# Altium integrated library LEMO Unipole And Multipole Type Connectors.IntLib: 1566 symbols (part 2 of 13) (continued)
## ECG.3B.320.CLV
designator J?
Fixed receptacle with two nuts, with elbow contact for printed circuit (back panel mounting), Key (G), 3B series, Multipole Type with 20 Contacts; Manufacturer: LEMO; PartNumber: ECG.3B.320.CLV; Number of contacts: 20; Contact Diameter: 0.7 mm; AWG: 24; Rated Current(A): 0; DatasheetVersion: Jun-14; PackageReference: ECG.3B.320.CLV; PackageDescription: Fixed receptacle with two nuts, with elbow contact for printed circuit (back panel mounting), Key(G) for Printed Circuit; Supplier 1: Mouser; Supplier Part Number 1: 736-ECG3B320CLV; Supplier 2: Digi-Key; Supplier Part Number 2: ECG.3B.320.CLV-ND; ComponentLink1Description: Manufacturer URL; ComponentLink1URL: http://www.lemo.com; ComponentLink2Description: Datasheet; ComponentLink2URL: http://intra.lemo.ch/catalog/ROW/UK_English/unipole_multipole.pdf
footprint ECG.3B.320.CLV (Socket, Female, Body 18mm dia. Height 25.8 mm, Through hole)
pins: 1, 2, 3, 4, 5, 6, 7, 8, 9, 10, 11, 12, 13, 14, 15, 16, 17, 18, 19, 20

## ECG.3B.324.CLN
designator J?
Fixed receptacle with two nuts and straight contact for printed circuit (back panel mounting), Key (G), 3B series, Multipole Type with 24 Contacts; Manufacturer: LEMO; PartNumber: ECG.3B.324.CLN; Number of contacts: 24; Contact Diameter: 0.7 mm; Rated Current(A): 4; DatasheetVersion: Jun-14; PackageReference: ECG.3B.324.CLN; PackageDescription: Fixed receptacle with two nuts and straight contact for printed circuit (back panel mounting), Key(G) for Printed Circuit; AWG: 24; ComponentLink1Description: Manufacturer URL; ComponentLink1URL: http://www.lemo.com; ComponentLink2Description: Datasheet; ComponentLink2URL: http://intra.lemo.ch/catalog/ROW/UK_English/unipole_multipole.pdf
footprint ECG.3B.324.CLN (Socket, Female, Body 18mm dia. Height 25.8 mm, Through hole)
pins: 1, 2, 3, 4, 5, 6, 7, 8, 9, 10, 11, 12, 13, 14, 15, 16, 17, 18, 19, 20, 21, 22, 23, 24

## ECG.3B.324.CLV
designator J?
Fixed receptacle with two nuts, with elbow contact for printed circuit (back panel mounting), Key (G), 3B series, Multipole Type with 24 Contacts; Manufacturer: LEMO; PartNumber: ECG.3B.324.CLV; Number of contacts: 24; Contact Diameter: 0.7 mm; Rated Current(A): 0; DatasheetVersion: Jun-14; PackageReference: ECG.3B.324.CLV; PackageDescription: Fixed receptacle with two nuts, with elbow contact for printed circuit (back panel mounting), Key(G) for Printed Circuit; Supplier 1: Mouser; Supplier Part Number 1: 736-ECG3B324CLV; Supplier 2: Digi-Key; Supplier Part Number 2: ECG.3B.324.CLV-ND; AWG: 24; ComponentLink1Description: Manufacturer URL; ComponentLink1URL: http://www.lemo.com; ComponentLink2Description: Datasheet; ComponentLink2URL: http://intra.lemo.ch/catalog/ROW/UK_English/unipole_multipole.pdf
footprint ECG.3B.324.CLV (Socket, Female, Body 18mm dia. Height 25.8 mm, Through hole)
pins: 1, 2, 3, 4, 5, 6, 7, 8, 9, 10, 11, 12, 13, 14, 15, 16, 17, 18, 19, 20, 21, 22, 23, 24

## ECG.3B.330.CLV
designator J?
Fixed receptacle with two nuts, with elbow contact for printed circuit (back panel mounting), Key (G), 3B series, Multipole Type with 30 Contacts; Manufacturer: LEMO; PartNumber: ECG.3B.330.CLV; Number of contacts: 30; Contact Diameter: 0.7 mm; AWG: 24; Rated Current(A): 0; DatasheetVersion: Jun-14; PackageReference: ECG.3B.330.CLV; PackageDescription: Fixed receptacle with two nuts, with elbow contact for printed circuit (back panel mounting), Key(G) for Printed Circuit; Supplier 1: Mouser; Supplier Part Number 1: 736-ECG3B330CLV; Supplier 2: Digi-Key; Supplier Part Number 2: ECG.3B.330.CLV-ND; ComponentLink1Description: Manufacturer URL; ComponentLink1URL: http://www.lemo.com; ComponentLink2Description: Datasheet; ComponentLink2URL: http://intra.lemo.ch/catalog/ROW/UK_English/unipole_multipole.pdf
footprint ECG.3B.330.CLV (Socket, Female, Body 18mm dia. Height 25.8 mm, Through hole)
pins: 1, 2, 3, 4, 5, 6, 7, 8, 9, 10, 11, 12, 13, 14, 15, 16, 17, 18, 19, 20, 21, 22, 23, 24, 25, 26, 27, 28, 29, 30

## ECG.4B.316.CLN
designator J?
Fixed receptacle with two nuts and straight contact for printed circuit (back panel mounting), Key (G), 4B series, Multipole Type with 16 Contacts; Manufacturer: LEMO; PartNumber: ECG.4B.316.CLN; Number of contacts: 16; Contact Diameter: 0.9 mm; AWG: 22; Rated Current(A): 10; DatasheetVersion: Jun-14; PackageReference: ECG.4B.316.CLN; PackageDescription: Fixed receptacle with two nuts and straight contact for printed circuit (back panel mounting), Key(G) for Printed Circuit; Supplier 1: Mouser; Supplier Part Number 1: 736-ECG4B316CLN; Supplier 2: Digi-Key; Supplier Part Number 2: ECG.4B.316.CLN-ND; ComponentLink1Description: Manufacturer URL; ComponentLink1URL: http://www.lemo.com; ComponentLink2Description: Datasheet; ComponentLink2URL: http://intra.lemo.ch/catalog/ROW/UK_English/unipole_multipole.pdf
footprint ECG.4B.316.CLN (Socket, Female, Body 25mm dia. Height 29.8 mm, Through hole)
pins: 1, 2, 3, 4, 5, 6, 7, 8, 9, 10, 11, 12, 13, 14, 15, 16

## ECG.4B.324.CLN
designator J?
Fixed receptacle with two nuts and straight contact for printed circuit (back panel mounting), Key (G), 4B series, Multipole Type with 24 Contacts; Manufacturer: LEMO; PartNumber: ECG.4B.324.CLN; Number of contacts: 24; Contact Diameter: 0.9 mm; AWG: 22; Rated Current(A): 7; DatasheetVersion: Jun-14; PackageReference: ECG.4B.324.CLN; PackageDescription: Fixed receptacle with two nuts and straight contact for printed circuit (back panel mounting), Key(G) for Printed Circuit; Supplier 1: Mouser; Supplier Part Number 1: 736-ECG4B324CLN; Supplier 2: Digi-Key; Supplier Part Number 2: ECG.4B.324.CLN-ND; ComponentLink1Description: Manufacturer URL; ComponentLink1URL: http://www.lemo.com; ComponentLink2Description: Datasheet; ComponentLink2URL: http://intra.lemo.ch/catalog/ROW/UK_English/unipole_multipole.pdf
footprint ECG.4B.324.CLN (Socket, Female, Body 25mm dia. Height 29.8 mm, Through hole)
pins: 1, 2, 3, 4, 5, 6, 7, 8, 9, 10, 11, 12, 13, 14, 15, 16, 17, 18, 19, 20, 21, 22, 23, 24

## ECN.0M.305.XLN
designator J?
Fixed receptacle with two nuts, Key (N), 0M series, Multipole Type with 5 Contacts; Manufacturer: LEMO; PartNumber: ECN.0M.305.XLN; Number of contacts: 5; Contact Diameter: 0.7 mm; AWG: 24; Rated Current(A): 6.5; DatasheetVersion: Jun-14; PackageReference: ECN.0M.305.XLN; PackageDescription: Fixed receptacle with two nuts, Key(N) for Printed Circuit; ComponentLink1Description: Manufacturer URL; ComponentLink1URL: http://www.lemo.com; ComponentLink2Description: Datasheet; ComponentLink2URL: http://intra.lemo.ch/catalog/ROW/UK_English/M_series.pdf
footprint ECN.0M.305.XLN (Socket, Female, Through hole)
pins: 1, 2, 3, 4, 5

## ECN.1M.308.XLN
designator J?
Fixed receptacle with two nuts, Key (N), 1M series, Multipole Type with 8 Contacts; Manufacturer: LEMO; PartNumber: ECN.1M.308.XLN; Number of contacts: 8; Contact Diameter: 0.7 mm; AWG: 24; Rated Current(A): 5; DatasheetVersion: Jun-14; PackageReference: ECN.1M.308.XLN; PackageDescription: Fixed receptacle with two nuts, Key(N) for Printed Circuit; ComponentLink1Description: Manufacturer URL; ComponentLink1URL: http://www.lemo.com; ComponentLink2Description: Datasheet; ComponentLink2URL: http://intra.lemo.ch/catalog/ROW/UK_English/M_series.pdf
footprint ECN.1M.308.XLN (Socket, Female, Through hole)
pins: 1, 2, 3, 4, 5, 6, 7, 8

## ECN.2M.319.XLN
designator J?
Fixed receptacle with two nuts, Key (N), 2M series, Multipole Type with 19 Contacts; Manufacturer: LEMO; PartNumber: ECN.2M.319.XLN; Number of contacts: 19; Contact Diameter: 0.7 mm; AWG: 24; Rated Current(A): 5; DatasheetVersion: Jun-14; PackageReference: ECN.2M.319.XLN; PackageDescription: Fixed receptacle with two nuts, Key(N) for Printed Circuit; ComponentLink1Description: Manufacturer URL; ComponentLink1URL: http://www.lemo.com; ComponentLink2Description: Datasheet; ComponentLink2URL: http://intra.lemo.ch/catalog/ROW/UK_English/M_series.pdf
footprint ECN.2M.319.XLN (Socket, Female, Through hole)
pins: 1, 2, 3, 4, 5, 6, 7, 8, 9, 10, 11, 12, 13, 14, 15, 16, 17, 18, 19

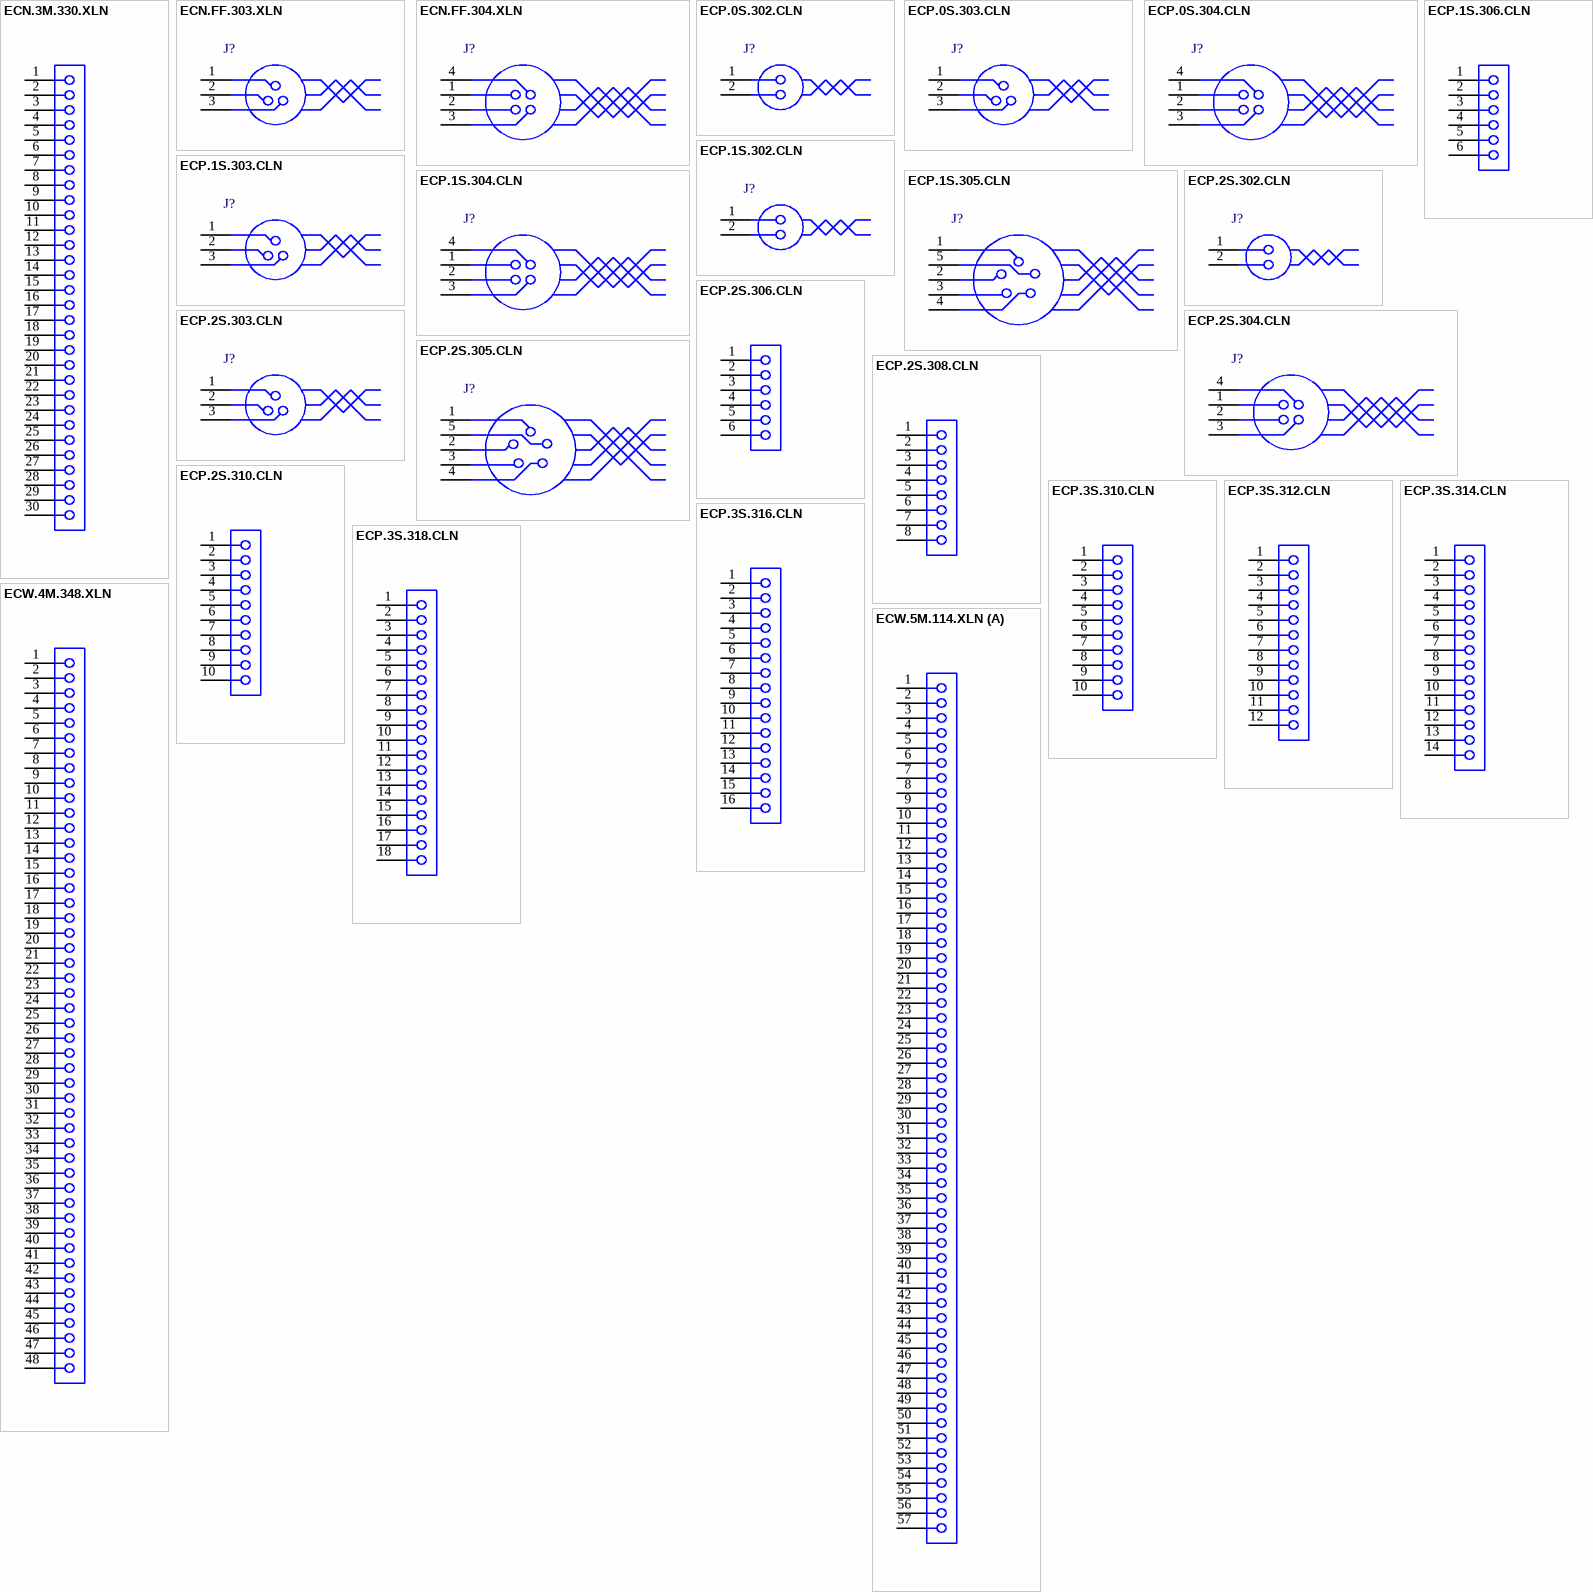
[diagram p4: symbols ECN.3M.330.XLN to ECW.5M.114.XLN]

## ECN.3M.330.XLN
designator J?
Fixed receptacle with two nuts, Key (N), 3M series, Multipole Type with 30 Contacts; Manufacturer: LEMO; PartNumber: ECN.3M.330.XLN; Number of contacts: 30; Contact Diameter: 0.7 mm; AWG: 24; Rated Current(A): 3.5; DatasheetVersion: Jun-14; PackageReference: ECN.3M.330.XLN; PackageDescription: Fixed receptacle with two nuts, Key(N) for Printed Circuit; ComponentLink1Description: Manufacturer URL; ComponentLink1URL: http://www.lemo.com; ComponentLink2Description: Datasheet; ComponentLink2URL: http://intra.lemo.ch/catalog/ROW/UK_English/M_series.pdf
footprint ECN.3M.330.XLN (Socket, Female, Through hole)
pins: 1, 2, 3, 4, 5, 6, 7, 8, 9, 10, 11, 12, 13, 14, 15, 16, 17, 18, 19, 20, 21, 22, 23, 24, 25, 26, 27, 28, 29, 30

## ECN.FF.303.XLN
designator J?
Fixed receptacle with 2 nuts key (N) or key (S), protruding shell (back panel mounting), Key (N), FF series, Multipole Type with; Manufacturer: LEMO; PartNumber: ECN.FF.303.XLN; Number of contacts: 0; Contact Diameter: 0.5 mm; AWG: 28; Test voltage Contact-Contact(Kv rms): 1.35; Test voltage Contact-Shell(Kv rms): 1.1; Rate Current(A): 3; DatasheetVersion: Jun-14; PackageReference: ECN.FF.303.XLN; PackageDescription: Fixed receptacle with 2 nuts key (N) or key (S), protruding shell (back panel mounting), Key(N) for Printed Circuit; ComponentLink1Description: Manufacturer URL; ComponentLink1URL: http://www.lemo.com; ComponentLink2Description: Datasheet; ComponentLink2URL: http://intra.lemo.ch/catalog/ROW/UK_English/f_series.pdf
footprint ECN.FF.303.XLN (Socket, Female, Through hole)
pins: 1, 2, 3

## ECN.FF.304.XLN
designator J?
Fixed receptacle with 2 nuts key (N) or key (S), protruding shell (back panel mounting), Key (N), FF series, Multipole Type with; Manufacturer: LEMO; PartNumber: ECN.FF.304.XLN; Number of contacts: 0; Contact Diameter: 0.5 mm; AWG: 28; Test voltage Contact-Contact(Kv rms): 1.05; Rate Current(A): 2; DatasheetVersion: Jun-14; PackageReference: ECN.FF.304.XLN; PackageDescription: Fixed receptacle with 2 nuts key (N) or key (S), protruding shell (back panel mounting), Key(N) for Printed Circuit; Supplier 1: Mouser; Supplier Part Number 1: 736-ECNFF304XLN; Supplier 2: Digi-Key; Supplier Part Number 2: ECN.FF.304.XLN-ND; Test voltage Contact-Shell(Kv rms): 1.05; ComponentLink1Description: Manufacturer URL; ComponentLink1URL: http://www.lemo.com; ComponentLink2Description: Datasheet; ComponentLink2URL: http://intra.lemo.ch/catalog/ROW/UK_English/f_series.pdf
footprint ECN.FF.304.XLN (Socket, Female, Through hole)
pins: 1, 2, 3, 4

## ECP.0S.302.CLN
designator J?
Fixed receptacle with two nuts, long threaded shell, with straight contact for printed circuit (back panel mounting), 0S series, Multipole Type with 2 Contacts; Manufacturer: LEMO; PartNumber: ECP.0S.302.CLN; Number of contacts: 2; Contact Diameter: 0.9 mm; AWG: 22; Rated Current(A): 10; DatasheetVersion: Jun-14; PackageReference: ECP.0S.302.CLN; PackageDescription: Fixed receptacle with two nuts, long threaded shell, with straight contact for printed circuit (back panel mounting), Key(P) for Printed Circuit; Supplier 1: Mouser; Supplier Part Number 1: 736-ECP.0S.302.CLN; Supplier 2: Digi-Key; Supplier Part Number 2: ECP.0S.302.CLN-ND; ComponentLink1Description: Manufacturer URL; ComponentLink1URL: http://www.lemo.com; ComponentLink2Description: Datasheet; ComponentLink2URL: http://intra.lemo.ch/catalog/ROW/UK_English/unipole_multipole.pdf
footprint ECP.0S.302.CLN (Socket, Female, Body 9mm dia. Height 15 mm, Through hole)
pins: 1, 2

## ECP.0S.303.CLN
designator J?
Fixed receptacle with two nuts, long threaded shell, with straight contact for printed circuit (back panel mounting), 0S series, Multipole Type with 3 Contacts; Manufacturer: LEMO; PartNumber: ECP.0S.303.CLN; Number of contacts: 3; Contact Diameter: 0.7 mm; AWG: 24; Rated Current(A): 7; DatasheetVersion: Jun-14; PackageReference: ECP.0S.303.CLN; PackageDescription: Fixed receptacle with two nuts, long threaded shell, with straight contact for printed circuit (back panel mounting), Key(P) for Printed Circuit; Supplier 1: Mouser; Supplier Part Number 1: 736-ECP0S303CLN; Supplier 2: Digi-Key; Supplier Part Number 2: ECP.0S.303.CLN-ND; ComponentLink1Description: Manufacturer URL; ComponentLink1URL: http://www.lemo.com; ComponentLink2Description: Datasheet; ComponentLink2URL: http://intra.lemo.ch/catalog/ROW/UK_English/unipole_multipole.pdf
footprint ECP.0S.303.CLN (Socket, Female, Body 9mm dia. Height 15 mm, Through hole)
pins: 1, 2, 3

## ECP.0S.304.CLN
designator J?
Fixed receptacle with two nuts, long threaded shell, with straight contact for printed circuit (back panel mounting), 0S series, Multipole Type with 4 Contacts; Manufacturer: LEMO; PartNumber: ECP.0S.304.CLN; Number of contacts: 4; Contact Diameter: 0.7 mm; AWG: 24; Rated Current(A): 7; DatasheetVersion: Jun-14; PackageReference: ECP.0S.304.CLN; PackageDescription: Fixed receptacle with two nuts, long threaded shell, with straight contact for printed circuit (back panel mounting), Key(P) for Printed Circuit; Supplier 1: Mouser; Supplier Part Number 1: 736-ECP0S304CLN; Supplier 2: Digi-Key; Supplier Part Number 2: ECP.0S.304.CLN-ND; ComponentLink1Description: Manufacturer URL; ComponentLink1URL: http://www.lemo.com; ComponentLink2Description: Datasheet; ComponentLink2URL: http://intra.lemo.ch/catalog/ROW/UK_English/unipole_multipole.pdf
footprint ECP.0S.304.CLN (Socket, Female, Body 9mm dia. Height 15 mm, Through hole)
pins: 1, 2, 3, 4

## ECP.1S.302.CLN
designator J?
Fixed receptacle with two nuts, long threaded shell, with straight contact for printed circuit (back panel mounting), 1S series, Multipole Type with 2 Contacts; Manufacturer: LEMO; PartNumber: ECP.1S.302.CLN; Number of contacts: 2; Contact Diameter: 1.3 mm; AWG: 20; Rated Current(A): 15; DatasheetVersion: Jun-14; PackageReference: ECP.1S.302.CLN; PackageDescription: Fixed receptacle with two nuts, long threaded shell, with straight contact for printed circuit (back panel mounting), Key(P) for Printed Circuit; ComponentLink1Description: Manufacturer URL; ComponentLink1URL: http://www.lemo.com; ComponentLink2Description: Datasheet; ComponentLink2URL: http://intra.lemo.ch/catalog/ROW/UK_English/unipole_multipole.pdf
footprint ECP.1S.302.CLN (Socket, Female, Body 12mm dia. Height 17.5 mm, Through hole)
pins: 1, 2

## ECP.1S.303.CLN
designator J?
Fixed receptacle with two nuts, long threaded shell, with straight contact for printed circuit (back panel mounting), 1S series, Multipole Type with 3 Contacts; Manufacturer: LEMO; PartNumber: ECP.1S.303.CLN; Number of contacts: 3; Contact Diameter: 0.9 mm; AWG: 22; Rated Current(A): 10; DatasheetVersion: Jun-14; PackageReference: ECP.1S.303.CLN; PackageDescription: Fixed receptacle with two nuts, long threaded shell, with straight contact for printed circuit (back panel mounting), Key(P) for Printed Circuit; ComponentLink1Description: Manufacturer URL; ComponentLink1URL: http://www.lemo.com; ComponentLink2Description: Datasheet; ComponentLink2URL: http://intra.lemo.ch/catalog/ROW/UK_English/unipole_multipole.pdf
footprint ECP.1S.303.CLN (Socket, Female, Body 12mm dia. Height 17.5 mm, Through hole)
pins: 1, 2, 3

## ECP.1S.304.CLN
designator J?
Fixed receptacle with two nuts, long threaded shell, with straight contact for printed circuit (back panel mounting), 1S series, Multipole Type with 4 Contacts; Manufacturer: LEMO; PartNumber: ECP.1S.304.CLN; Number of contacts: 4; Contact Diameter: 0.9 mm; AWG: 22; Rated Current(A): 10; DatasheetVersion: Jun-14; PackageReference: ECP.1S.304.CLN; PackageDescription: Fixed receptacle with two nuts, long threaded shell, with straight contact for printed circuit (back panel mounting), Key(P) for Printed Circuit; Supplier 1: Mouser; Supplier Part Number 1: 736-ECP1S304CLN; Supplier 2: Digi-Key; Supplier Part Number 2: ECP.1S.304.CLN-ND; ComponentLink1Description: Manufacturer URL; ComponentLink1URL: http://www.lemo.com; ComponentLink2Description: Datasheet; ComponentLink2URL: http://intra.lemo.ch/catalog/ROW/UK_English/unipole_multipole.pdf
footprint ECP.1S.304.CLN (Socket, Female, Body 12mm dia. Height 17.5 mm, Through hole)
pins: 1, 2, 3, 4

## ECP.1S.305.CLN
designator J?
Fixed receptacle with two nuts, long threaded shell, with straight contact for printed circuit (back panel mounting), 1S series, Multipole Type with 5 Contacts; Manufacturer: LEMO; PartNumber: ECP.1S.305.CLN; Number of contacts: 5; AWG: 0; DatasheetVersion: Jun-14; PackageReference: ECP.1S.305.CLN; PackageDescription: Fixed receptacle with two nuts, long threaded shell, with straight contact for printed circuit (back panel mounting), Key(P) for Printed Circuit; Rated Current(A): 0; ComponentLink1Description: Manufacturer URL; ComponentLink1URL: http://www.lemo.com; ComponentLink2Description: Datasheet; ComponentLink2URL: http://intra.lemo.ch/catalog/ROW/UK_English/unipole_multipole.pdf
footprint ECP.1S.305.CLN (Socket, Female, Body 12mm dia. Height 17.5 mm, Through hole)
pins: 1, 2, 3, 4, 5

## ECP.1S.306.CLN
designator J?
Fixed receptacle with two nuts, long threaded shell, with straight contact for printed circuit (back panel mounting), 1S series, Multipole Type with 6 Contacts; Manufacturer: LEMO; PartNumber: ECP.1S.306.CLN; Number of contacts: 6; Contact Diameter: 0.7 mm; AWG: 24; Rated Current(A): 7; DatasheetVersion: Jun-14; PackageReference: ECP.1S.306.CLN; PackageDescription: Fixed receptacle with two nuts, long threaded shell, with straight contact for printed circuit (back panel mounting), Key(P) for Printed Circuit; Supplier 1: Mouser; Supplier Part Number 1: 736-ECP1S306CLN; Supplier 2: Digi-Key; Supplier Part Number 2: ECP.1S.306.CLN-ND; ComponentLink1Description: Manufacturer URL; ComponentLink1URL: http://www.lemo.com; ComponentLink2Description: Datasheet; ComponentLink2URL: http://intra.lemo.ch/catalog/ROW/UK_English/unipole_multipole.pdf
footprint ECP.1S.306.CLN (Socket, Female, Body 12mm dia. Height 17.5 mm, Through hole)
pins: 1, 2, 3, 4, 5, 6

## ECP.2S.302.CLN
designator J?
Fixed receptacle with two nuts, long threaded shell, with straight contact for printed circuit (back panel mounting), 2S series, Multipole Type with 2 Contacts; Manufacturer: LEMO; PartNumber: ECP.2S.302.CLN; Number of contacts: 2; AWG: 16; Rated Current(A): 20; DatasheetVersion: Jun-14; PackageReference: ECP.2S.302.CLN; PackageDescription: Fixed receptacle with two nuts, long threaded shell, with straight contact for printed circuit (back panel mounting), Key(P) for Printed Circuit; Supplier 1: Mouser; Supplier Part Number 1: 736-ECP2S302CLN; Supplier 2: Digi-Key; Supplier Part Number 2: ECP.2S.302.CLN-ND; ComponentLink1Description: Manufacturer URL; ComponentLink1URL: http://www.lemo.com; ComponentLink2Description: Datasheet; ComponentLink2URL: http://intra.lemo.ch/catalog/ROW/UK_English/unipole_multipole.pdf
footprint ECP.2S.302.CLN (Socket, Female, Body 15mm dia., Through hole)
pins: 1, 2

## ECP.2S.303.CLN
designator J?
Fixed receptacle with two nuts, long threaded shell, with straight contact for printed circuit (back panel mounting), 2S series, Multipole Type with 3 Contacts; Manufacturer: LEMO; PartNumber: ECP.2S.303.CLN; Number of contacts: 3; Contact Diameter: 1.3 mm; AWG: 20; Rated Current(A): 15; DatasheetVersion: Jun-14; PackageReference: ECP.2S.303.CLN; PackageDescription: Fixed receptacle with two nuts, long threaded shell, with straight contact for printed circuit (back panel mounting), Key(P) for Printed Circuit; ComponentLink1Description: Manufacturer URL; ComponentLink1URL: http://www.lemo.com; ComponentLink2Description: Datasheet; ComponentLink2URL: http://intra.lemo.ch/catalog/ROW/UK_English/unipole_multipole.pdf
footprint ECP.2S.303.CLN (Socket, Female, Body 15mm dia., Through hole)
pins: 1, 2, 3

## ECP.2S.304.CLN
designator J?
Fixed receptacle with two nuts, long threaded shell, with straight contact for printed circuit (back panel mounting), 2S series, Multipole Type with 4 Contacts; Manufacturer: LEMO; PartNumber: ECP.2S.304.CLN; Number of contacts: 4; Contact Diameter: 1.3 mm; AWG: 20; Rated Current(A): 15; DatasheetVersion: Jun-14; PackageReference: ECP.2S.304.CLN; PackageDescription: Fixed receptacle with two nuts, long threaded shell, with straight contact for printed circuit (back panel mounting), Key(P) for Printed Circuit; ComponentLink1Description: Manufacturer URL; ComponentLink1URL: http://www.lemo.com; ComponentLink2Description: Datasheet; ComponentLink2URL: http://intra.lemo.ch/catalog/ROW/UK_English/unipole_multipole.pdf
footprint ECP.2S.304.CLN (Socket, Female, Body 15mm dia., Through hole)
pins: 1, 2, 3, 4

## ECP.2S.305.CLN
designator J?
Fixed receptacle with two nuts, long threaded shell, with straight contact for printed circuit (back panel mounting), 2S series, Multipole Type with 5 Contacts; Manufacturer: LEMO; PartNumber: ECP.2S.305.CLN; Number of contacts: 5; Contact Diameter: 1.3 mm; AWG: 20; Rated Current(A): 13; DatasheetVersion: Jun-14; PackageReference: ECP.2S.305.CLN; PackageDescription: Fixed receptacle with two nuts, long threaded shell, with straight contact for printed circuit (back panel mounting), Key(P) for Printed Circuit; ComponentLink1Description: Manufacturer URL; ComponentLink1URL: http://www.lemo.com; ComponentLink2Description: Datasheet; ComponentLink2URL: http://intra.lemo.ch/catalog/ROW/UK_English/unipole_multipole.pdf
footprint ECP.2S.305.CLN (Socket, Female, Body 15mm dia., Through hole)
pins: 1, 2, 3, 4, 5

## ECP.2S.306.CLN
designator J?
Fixed receptacle with two nuts, long threaded shell, with straight contact for printed circuit (back panel mounting), 2S series, Multipole Type with 6 Contacts; Manufacturer: LEMO; PartNumber: ECP.2S.306.CLN; Number of contacts: 6; Contact Diameter: 1.3 mm; AWG: 20; Rated Current(A): 12; DatasheetVersion: Jun-14; PackageReference: ECP.2S.306.CLN; PackageDescription: Fixed receptacle with two nuts, long threaded shell, with straight contact for printed circuit (back panel mounting), Key(P) for Printed Circuit; ComponentLink1Description: Manufacturer URL; ComponentLink1URL: http://www.lemo.com; ComponentLink2Description: Datasheet; ComponentLink2URL: http://intra.lemo.ch/catalog/ROW/UK_English/unipole_multipole.pdf
footprint ECP.2S.306.CLN (Socket, Female, Body 15mm dia., Through hole)
pins: 1, 2, 3, 4, 5, 6

## ECP.2S.308.CLN
designator J?
Fixed receptacle with two nuts, long threaded shell, with straight contact for printed circuit (back panel mounting), 2S series, Multipole Type with 8 Contacts; Manufacturer: LEMO; PartNumber: ECP.2S.308.CLN; Number of contacts: 8; Contact Diameter: 0.9 mm; AWG: 22; Rated Current(A): 9; DatasheetVersion: Jun-14; PackageReference: ECP.2S.308.CLN; PackageDescription: Fixed receptacle with two nuts, long threaded shell, with straight contact for printed circuit (back panel mounting), Key(P) for Printed Circuit; Supplier 1: Mouser; Supplier Part Number 1: 736-ECP2S308CLN; Supplier 2: Digi-Key; Supplier Part Number 2: ECP.2S.308.CLN-ND; ComponentLink1Description: Manufacturer URL; ComponentLink1URL: http://www.lemo.com; ComponentLink2Description: Datasheet; ComponentLink2URL: http://intra.lemo.ch/catalog/ROW/UK_English/unipole_multipole.pdf
footprint ECP.2S.308.CLN (Socket, Female, Body 15mm dia., Through hole)
pins: 1, 2, 3, 4, 5, 6, 7, 8

## ECP.2S.310.CLN
designator J?
Fixed receptacle with two nuts, long threaded shell, with straight contact for printed circuit (back panel mounting), 2S series, Multipole Type with 10 Contacts; Manufacturer: LEMO; PartNumber: ECP.2S.310.CLN; Number of contacts: 10; Contact Diameter: 0.9 mm; AWG: 22; Rated Current(A): 7; DatasheetVersion: Jun-14; PackageReference: ECP.2S.310.CLN; PackageDescription: Fixed receptacle with two nuts, long threaded shell, with straight contact for printed circuit (back panel mounting), Key(P) for Printed Circuit; Supplier 1: Mouser; Supplier Part Number 1: 736-ECP2S310CLN; Supplier 2: Newark; Supplier Part Number 2: 44W1624; Supplier 3: Digi-Key; Supplier Part Number 3: ECP.2S.310.CLN-ND; ComponentLink1Description: Manufacturer URL; ComponentLink1URL: http://www.lemo.com; ComponentLink2Description: Datasheet; ComponentLink2URL: http://intra.lemo.ch/catalog/ROW/UK_English/unipole_multipole.pdf
footprint ECP.2S.310.CLN (Socket, Female, Body 15mm dia., Through hole)
pins: 1, 2, 3, 4, 5, 6, 7, 8, 9, 10

## ECP.3S.310.CLN
designator J?
Fixed receptacle with two nuts, long threaded shell, with straight contact for printed circuit (back panel mounting), 3S series, Multipole Type with 10 Contacts; Manufacturer: LEMO; PartNumber: ECP.3S.310.CLN; Number of contacts: 10; Contact Diameter: 1.3 mm; AWG: 20; Rated Current(A): 9; DatasheetVersion: Jun-14; PackageReference: ECP.3S.310.CLN; PackageDescription: Fixed receptacle with two nuts, long threaded shell, with straight contact for printed circuit (back panel mounting), Key(P) for Printed Circuit; Supplier 1: Mouser; Supplier Part Number 1: 736-ECP3S310CLN; Supplier 2: Digi-Key; Supplier Part Number 2: ECP.3S.310.CLN-ND; ComponentLink1Description: Manufacturer URL; ComponentLink1URL: http://www.lemo.com; ComponentLink2Description: Datasheet; ComponentLink2URL: http://intra.lemo.ch/catalog/ROW/UK_English/unipole_multipole.pdf
footprint ECP.3S.310.CLN (Socket, Female, Body 18mm dia. Height 24 mm, Through hole)
pins: 1, 2, 3, 4, 5, 6, 7, 8, 9, 10

## ECP.3S.312.CLN
designator J?
Fixed receptacle with two nuts, long threaded shell, with straight contact for printed circuit (back panel mounting), 3S series, Multipole Type with 12 Contacts; Manufacturer: LEMO; PartNumber: ECP.3S.312.CLN; Number of contacts: 12; Contact Diameter: 0.9 mm; AWG: 22; Rated Current(A): 8; DatasheetVersion: Jun-14; PackageReference: ECP.3S.312.CLN; PackageDescription: Fixed receptacle with two nuts, long threaded shell, with straight contact for printed circuit (back panel mounting), Key(P) for Printed Circuit; ComponentLink1Description: Manufacturer URL; ComponentLink1URL: http://www.lemo.com; ComponentLink2Description: Datasheet; ComponentLink2URL: http://intra.lemo.ch/catalog/ROW/UK_English/unipole_multipole.pdf
footprint ECP.3S.312.CLN (Socket, Female, Body 18mm dia. Height 24 mm, Through hole)
pins: 1, 2, 3, 4, 5, 6, 7, 8, 9, 10, 11, 12

## ECP.3S.314.CLN
designator J?
Fixed receptacle with two nuts, long threaded shell, with straight contact for printed circuit (back panel mounting), 3S series, Multipole Type with 14 Contacts; Manufacturer: LEMO; PartNumber: ECP.3S.314.CLN; Number of contacts: 14; Contact Diameter: 0.9 mm; AWG: 22; Rated Current(A): 7; DatasheetVersion: Jun-14; PackageReference: ECP.3S.314.CLN; PackageDescription: Fixed receptacle with two nuts, long threaded shell, with straight contact for printed circuit (back panel mounting), Key(P) for Printed Circuit; ComponentLink1Description: Manufacturer URL; ComponentLink1URL: http://www.lemo.com; ComponentLink2Description: Datasheet; ComponentLink2URL: http://intra.lemo.ch/catalog/ROW/UK_English/unipole_multipole.pdf
footprint ECP.3S.314.CLN (Socket, Female, Body 18mm dia. Height 24 mm, Through hole)
pins: 1, 2, 3, 4, 5, 6, 7, 8, 9, 10, 11, 12, 13, 14

## ECP.3S.316.CLN
designator J?
Fixed receptacle with two nuts, long threaded shell, with straight contact for printed circuit (back panel mounting), 3S series, Multipole Type with 16 Contacts; Manufacturer: LEMO; PartNumber: ECP.3S.316.CLN; Number of contacts: 16; Contact Diameter: 0.9 mm; AWG: 22; Rated Current(A): 7; DatasheetVersion: Jun-14; PackageReference: ECP.3S.316.CLN; PackageDescription: Fixed receptacle with two nuts, long threaded shell, with straight contact for printed circuit (back panel mounting), Key(P) for Printed Circuit; ComponentLink1Description: Manufacturer URL; ComponentLink1URL: http://www.lemo.com; ComponentLink2Description: Datasheet; ComponentLink2URL: http://intra.lemo.ch/catalog/ROW/UK_English/unipole_multipole.pdf
footprint ECP.3S.316.CLN (Socket, Female, Body 18mm dia. Height 24 mm, Through hole)
pins: 1, 2, 3, 4, 5, 6, 7, 8, 9, 10, 11, 12, 13, 14, 15, 16

## ECP.3S.318.CLN
designator J?
Fixed receptacle with two nuts, long threaded shell, with straight contact for printed circuit (back panel mounting), 3S series, Multipole Type with 18 Contacts; Manufacturer: LEMO; PartNumber: ECP.3S.318.CLN; Number of contacts: 18; Contact Diameter: 0.9 mm; AWG: 22; Rated Current(A): 6; DatasheetVersion: Jun-14; PackageReference: ECP.3S.318.CLN; PackageDescription: Fixed receptacle with two nuts, long threaded shell, with straight contact for printed circuit (back panel mounting), Key(P) for Printed Circuit; ComponentLink1Description: Manufacturer URL; ComponentLink1URL: http://www.lemo.com; ComponentLink2Description: Datasheet; ComponentLink2URL: http://intra.lemo.ch/catalog/ROW/UK_English/unipole_multipole.pdf
footprint ECP.3S.318.CLN (Socket, Female, Body 18mm dia. Height 24 mm, Through hole)
pins: 1, 2, 3, 4, 5, 6, 7, 8, 9, 10, 11, 12, 13, 14, 15, 16, 17, 18

## ECW.4M.348.XLN
designator J?
Fixed receptacle with two nuts, Key (W), 4M series, Multipole Type with 48 Contacts; Manufacturer: LEMO; PartNumber: ECW.4M.348.XLN; Number of contacts: 48; Contact Diameter: 0.7 mm; AWG: 24; Rated Current(A): 3; DatasheetVersion: Jun-14; PackageReference: ECW.4M.348.XLN; PackageDescription: Fixed receptacle with two nuts, Key(W) for Printed Circuit; ComponentLink1Description: Manufacturer URL; ComponentLink1URL: http://www.lemo.com; ComponentLink2Description: Datasheet; ComponentLink2URL: http://intra.lemo.ch/catalog/ROW/UK_English/M_series.pdf
footprint ECW.4M.348.XLN (Socket, Female, Through hole)
pins: 1, 2, 3, 4, 5, 6, 7, 8, 9, 10, 11, 12, 13, 14, 15, 16, 17, 18, 19, 20, 21, 22, 23, 24, 25, 26, 27, 28, 29, 30, 31, 32, 33, 34, 35, 36, 37, 38, 39, 40, 41, 42, 43, 44, 45, 46, 47, 48
